# Altium footprint library BARKO_PCBLIB.PcbLib: 531 footprints (part 6 of 34)
Each footprint in its own frame and in the unit in brackets; x right, y up, seen from the top. Pads: shape width x height; smd on the part's side, far side on the other; paste and mask are expansions set on the pad; w line width, h text height; cw(c..) or ccw(c..) is an arc to the next point about the centre after c.
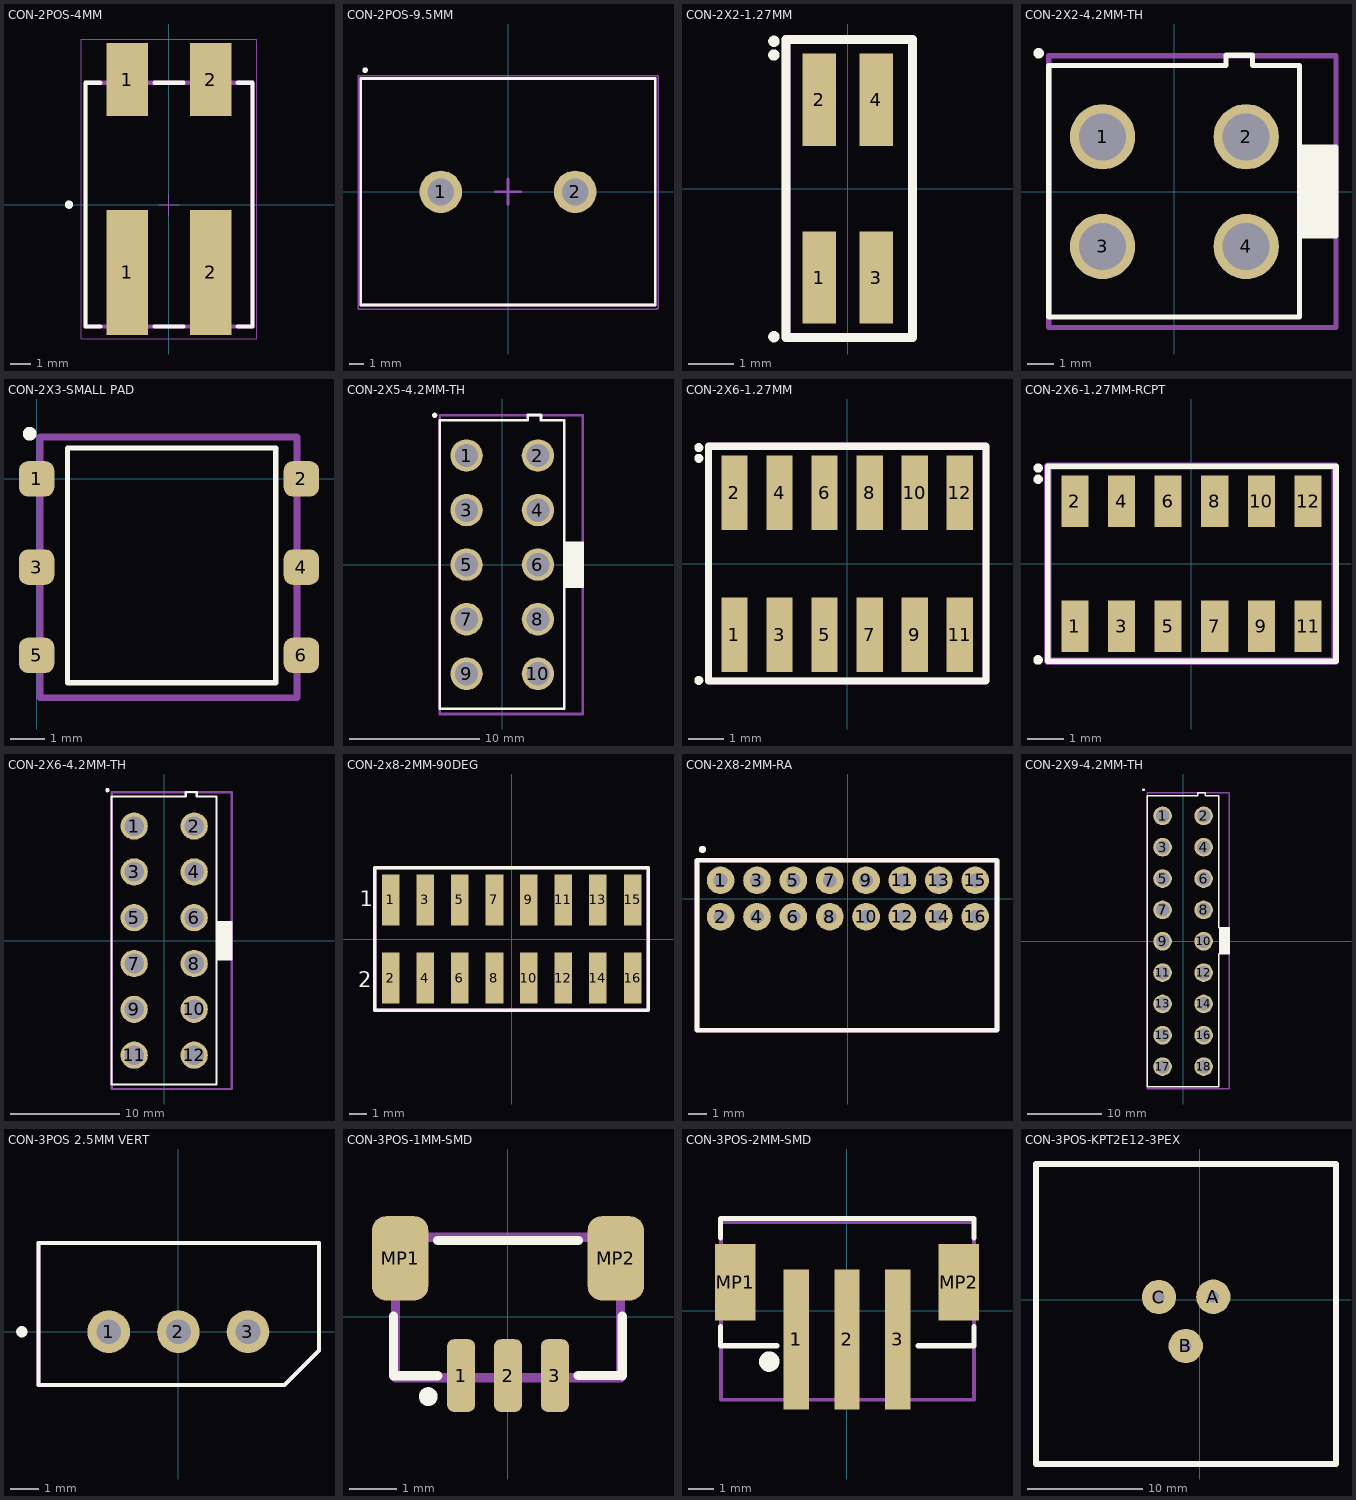
[diagram p5: the footprints below, top view; thin cyan lines are the x and y axes]

## CON-2POS-4MM [mm] "SMT Horizontal Entry Connector, 2p"
height 2.3
pads (4):
  rect 2x6 smd: 1(-2,-3.25) 2(2,-3.25)
  rect 2x3.5 smd: 1(-2,6) 2(2,6)
Top Overlay:
  circle w0.2: c-4.8,0 r0.1
  lines w0.2: -3.3,-5.85 -4,-5.85 -4,5.85 -3.3,5.85 ; -0.7,-5.85 0.7,-5.85 ; -0.7,5.85 0.7,5.85 ; 3.3,-5.85 4,-5.85 4,5.85 3.3,5.85
Mechanical 15:
  lines w0.05: -0.5,0 0.5,0 ; 0,-0.5 0,0.5 ; -4.2,-6.45 4.2,-6.45 4.2,7.95 -4.2,7.95 -4.2,-6.45
ASM Top:
  lines w0.2: -4,-5.85 4,-5.85 4,5.85 -4,5.85 -4,-5.85
  text ".designator" at -0.5,0 h0.8
3D body "695402400222.stp": height 4.57, standoff -0.03, extent -4,-5.85 4,7.25

## CON-2POS-9.5MM [mm]
pads (2):
  round 3 hole 1.9 unplated: 1(-4.75,0) 2(4.75,0)
Top Overlay:
  circle w0.2: c-10.1,8.6 r0.1
  lines w0.2: -10.4,-8 10.4,-8 10.4,8 -10.4,8 -10.4,-8
Mechanical 15:
  lines w0.1: -10.6,-8.3 -10.6,8.2 10.6,8.2 10.6,-8.2 10.5,-8.3 -10.6,-8.3
  lines w0.2: -0.9,0 0,0 ; 0,-0.9 0,0 ; 0,0.9 0,0 ; 0.9,0 0,0
ASM Top:
  lines w0.2: -10.4,-8 -10.4,8 10.4,8 10.4,-8 -10.4,-8
  text ".designator" at -0.6,-0.2 h1.5
3D body "c-3-1437664-0-m-3d.stp": height 16.4, standoff -4.56, extent -10.3,-7.938 10.3,7.937

## CON-2X2-1.27MM [mm]
pads (4):
  rect 0.74x2.05 smd mask+0.05: 1(-0.635,-1.975) 2(-0.635,1.975) 3(0.635,-1.975) 4(0.635,1.975)
Top Overlay:
  circle w0.15: c-1.64,3.275 r0.051
  circle w0.15: c-1.64,2.97 r0.051
  circle w0.15: c-1.64,-3.29 r0.051
  lines w0.15: -1.372,2.845 -1.372,3.31
  lines w0.2: -1.372,-3.31 1.445,-3.31 1.445,3.31 -1.372,3.31 -1.372,-3.31
ASM Top:
  lines w0.2: -1.372,-3.31 1.445,-3.31 1.445,3.31 -1.372,3.31 -1.372,-3.31
  text ".designator" at 0.11,-0.25 h0.8
3D body "FLE-102-01-G-DV.stp": height 4.56, standoff 0.01, extent -1.327,-2.297 1.327,2.297

## CON-2X2-4.2MM-TH [mm]
pads (4):
  round 2.5 hole 1.8: 1(-2.75,2.1) 2(2.75,2.1) 3(-2.75,-2.1) 4(2.75,-2.1)
Top Overlay:
  circle w0.2: c-5.2,5.3 r0.1
  rectangle: 4.787,-1.7 6.187,1.7
  lines w0.2: 4.787,3.825 4.787,-4.8 ; 4.787,-4.8 -4.813,-4.8 -4.813,4.824 1.977,4.825 1.977,5.224 2.988,5.224 2.988,4.825 4.787,4.825 4.787,1.7 6.187,1.7 6.187,-1.7 4.787,-1.7 4.787,-4.8
ASM Top:
  lines w0.2: -4.812,-5.2 -4.812,5.2 6.188,5.2 6.188,-5.2 -4.812,-5.2
  text ".designator" at -1.5,0 h0.8
3D body "039288040.stp": height 12.81, standoff -3.49, extent -4.8,-5.2 6.2,5.2

## CON-2X3-SMALL PAD [mil]
pads (6):
  rrect50% 40x40 smd mask+2: 1(0,0) 2(300,0) 3(0,-100) 4(300,-100) 5(0,-200) 6(300,-200)
Top Overlay:
  circle w7.87: c-7.87,51.18 r3.94
  lines w6: 35,-231 271,-231 271,35 35,35 35,-231
ASM Top:
  lines w7.87: 3.94,-248.03 3.94,47.24 295.28,47.24 295.28,-248.03 3.94,-248.03
  text ".designator" at 118.11,-82.68 h31.5
3D body "HN2X3 SMD.STEP": height 493.41, standoff 0.5, extent 3.66,-248 295,49.34

## CON-2X5-4.2MM-TH [mm]
pads (10):
  round 2.5 hole 1.8: 1(-2.75,8.4) 2(2.75,8.4) 3(-2.75,4.2) 4(2.75,4.2) 5(-2.75,0) 6(2.75,0) 7(-2.75,-4.2) 8(2.75,-4.2) 9(-2.75,-8.4) 10(2.75,-8.4)
Top Overlay:
  circle w0.2: c-5.2,11.5 r0.1
  rectangle: 4.787,-1.7 6.187,1.7
  lines w0.2: 4.787,10.124 4.787,-1.7 ; 4.787,-1.7 4.787,-11.1 -4.813,-11.1 -4.813,11.124 1.977,11.124 1.977,11.524 2.988,11.524 2.988,11.124 4.787,11.124 4.787,1.7 6.187,1.7 6.187,-1.7 4.787,-1.7
ASM Top:
  lines w0.2: -4.812,-11.5 -4.812,11.5 6.188,11.5 6.188,-11.5 -4.812,-11.5
  text ".designator" at -1.524,-0.243 h0.8
3D body "039293106.stp": height 12.81, standoff -3.49, extent -4.8,-11.5 6.2,11.5

## CON-2X6-1.27MM [mm] "CONN HEADER SMD 12POS 1.27MM"
pads (12):
  rect 0.74x2.1 smd mask+0.05: 1(-3.175,-2) 2(-3.175,2) 3(-1.905,-2) 4(-1.905,2) 5(-0.635,-2) 6(-0.635,2) 7(0.635,-2) 8(0.635,2) 9(1.905,-2) 10(1.905,2) 11(3.175,-2) 12(3.175,2)
Top Overlay:
  circle w0.15: c-4.18,-3.29 r0.051
  circle w0.15: c-4.18,2.97 r0.051
  circle w0.15: c-4.18,3.275 r0.051
  lines w0.15: -3.912,2.845 -3.912,3.31
  lines w0.2: -3.912,-3.31 -3.912,3.31 3.912,3.31 3.912,-3.31 -3.912,-3.31
ASM Top:
  lines w0.2: -3.912,-3.31 -3.912,3.31 3.912,3.31 3.912,-3.31 -3.912,-3.31
  text ".designator" at -2.43,-0.25 h0.8
3D body "FTSH-106-01-F-DV-P-TR.stp": height 7, standoff 0.01, extent -3.81,-2.921 3.81,2.921

## CON-2X6-1.27MM-RCPT [mm] "CONN RCPT 12POS 0.05 GOLD SMD"
pads (12):
  rect 0.74x1.4 smd mask+0.05: 1(-3.175,-1.7) 2(-3.175,1.7) 3(-1.905,-1.7) 4(-1.905,1.7) 5(-0.635,-1.7) 6(-0.635,1.7) 7(0.635,-1.7) 8(0.635,1.7) 9(1.905,-1.7) 10(1.905,1.7) 11(3.175,-1.7) 12(3.175,1.7)
Top Overlay:
  circle w0.15: c-4.18,-2.62 r0.055
  circle w0.15: c-4.176,2.3 r0.051
  circle w0.15: c-4.176,2.605 r0.051
  lines w0.15: -3.912,-2.66 -3.912,2.66 1.79,2.66 3.937,2.66 3.937,-2.66 -3.912,-2.66
ASM Top:
  lines w0.2: -3.912,-2.66 3.912,-2.66 3.912,2.66 -3.912,2.66 -3.912,-2.66
  text ".designator" at -2.85,-0.24 h0.8
3D body "FLE-106-01-G-DV-K-TR.stp": height 4.69, standoff 0.01, extent -3.867,-2.297 3.867,2.297

## CON-2X6-4.2MM-TH [mm]
pads (12):
  round 2.5 hole 1.8: 1(-2.75,10.5) 2(2.75,10.5) 3(-2.75,6.3) 4(2.75,6.3) 5(-2.75,2.1) 6(2.75,2.1) 7(-2.75,-2.1) 8(2.75,-2.1) 9(-2.75,-6.3) 10(2.75,-6.3) 11(-2.75,-10.5) 12(2.75,-10.5)
Top Overlay:
  circle w0.2: c-5.2,13.8 r0.1
  rectangle: 4.787,-1.7 6.187,1.7
  lines w0.2: 4.787,12.224 4.787,-1.7 ; 4.787,-1.7 4.787,-13.2 -4.813,-13.2 -4.813,13.224 1.977,13.224 1.977,13.624 2.988,13.624 2.988,13.224 4.787,13.224 4.787,1.7 6.187,1.7 6.187,-1.7 4.787,-1.7
ASM Top:
  lines w0.2: -4.812,-13.6 -4.812,13.6 6.188,13.6 6.188,-13.6 -4.812,-13.6
  text ".designator" at -2.1,0 h0.8
3D body "039293126.stp": height 12.81, standoff -3.49, extent -4.8,-13.6 6.2,13.6

## CON-2x8-2MM-90DEG [mil]
pads (16):
  rect 40x116 smd: 1(-276,89) 2(-276,-89) 3(-197,89) 4(-197,-89) 5(-118,89) 6(-118,-89) 7(-39,89) 8(-39,-89) 9(39,89) 10(39,-89) 11(118,89) 12(118,-89) 13(197,89) 14(197,-89) 15(276,89) 16(276,-89)
Top Overlay:
  lines w8: -312,-163 -312,163 312,163 312,-163 -312,-163
  text "1" at -346.46,62.99 h60
  text "2" at -350.39,-122.05 h60
ASM Top:
  lines w8: -312,-163 -312,163 312,163 312,-163 -312,-163
  text ".designator" at -299,-13 h31.5
3D body "2x8 2mm 90.stp": height 235.5, standoff 0.5, extent -313.95,-139.99 315.97,138.01

## CON-2X8-2MM-RA [mil]
pads (16):
  round 60 hole 30: 1(-275.59,39.37) 2(-275.59,-39.37) 3(-196.85,39.37) 4(-196.85,-39.37) 5(-118.11,39.37) 6(-118.11,-39.37) 7(-39.37,39.37) 8(-39.37,-39.37) 9(39.37,39.37) 10(39.37,-39.37) 11(118.11,39.37) 12(118.11,-39.37) 13(196.85,39.37) 14(196.85,-39.37) 15(275.59,39.37) 16(275.59,-39.37)
Top Overlay:
  circle w7.87: c-314.96,106.3 r3.94
  lines w10: -326.77,-285.52 -326.77,82.68 322.83,82.68 322.83,-285.52 -326.77,-285.52
ASM Top:
  lines w10: -326.77,-285.52 322.83,-285.52 322.83,82.68 -326.77,82.68 -326.77,-285.52
  text ".designator" at -303.15,-122.05 h31.5
3D body "2x8-2MM-RA-HEADER.stp": height 159.3, standoff -116.61, extent -314.96,-285.52 314.96,49.3

## CON-2X9-4.2MM-TH [mm]
pads (18):
  round 2.5 hole 1.8: 1(-2.75,16.8) 2(2.75,16.8) 3(-2.75,12.6) 4(2.75,12.6) 5(-2.75,8.4) 6(2.75,8.4) 7(-2.75,4.2) 8(2.75,4.2) 9(-2.75,0) 10(2.75,0) 11(-2.75,-4.2) 12(2.75,-4.2) 13(-2.75,-8.4) 14(2.75,-8.4) 15(-2.75,-12.6) 16(2.75,-12.6) 17(-2.75,-16.8) 18(2.75,-16.8)
Top Overlay:
  circle w0.2: c-5.3,20.3 r0.1
  rectangle: 4.787,-1.7 6.187,1.7
  lines w0.2: 4.787,4.6 4.787,18.524 ; -4.813,-19.5 4.787,-19.5 4.787,-1.7 6.187,-1.7 6.187,1.8 4.787,1.8 4.787,19.524 2.988,19.524 2.988,19.924 1.977,19.924 1.977,19.524 -4.813,19.524 -4.813,-19.5
ASM Top:
  lines w0.2: -4.812,-19.8 6.188,-19.8 6.188,19.9 -4.812,19.9 -4.812,-19.8
  text ".designator" at -2.75,0 h0.8
3D body "039281183.stp": height 12.81, standoff -3.49, extent -4.8,-19.9 6.2,19.9

## CON-3POS 2.5MM VERT [mil]
pads (3):
  round 60 hole 35: 1(-98,0) 2(0,0) 3(98,0)
Top Overlay:
  circle w7.87: c-220.47,0 r3.94
  lines w6: -197,-75 149.41,-75 198,-26.41 198,125 -197,125 -197,-75
ASM Top:
  lines w6: -197,-75 149.41,-75 198,-26.41 198,125 -197,125 -197,-75
  text ".designator" at -47.24,47.24 h31.5
3D body "022035035.stp": height 231.14, standoff -138.94, extent -194.88,-72.05 194.88,120.87

## CON-3POS-1MM-SMD [mm]
pads (5):
  rrect50% 0.6x1.55 smd mask+0.05: 1(-1,-1.25) 2(0,-1.25) 3(1,-1.25)
  rrect50% 1.2x1.8 smd mask+0.05: MP1(-2.3,1.25) MP2(2.3,1.25)
Top Overlay:
  circle w0.2: c-1.7,-1.7 r0.1
  lines w0.2: -2.442,0.015 -2.442,-1.251 -1.5,-1.251 ; -1.5,1.631 1.5,1.631 ; 1.5,-1.25 2.44,-1.25 ; 2.441,-1.251 2.441,0.015
ASM Top:
  lines w0.2: -2.4,1.7 -2.4,-1.3 2.4,-1.3 2.4,1.7 -2.35,1.7
  text ".designator" at -0.4,-0.2 h0.8
3D body "5013310307.stp": height 5.5, standoff -0.04, extent -2.62,-1.91 2.62,1.94

## CON-3POS-2MM-SMD [mm]
pads (6):
  rect 1x5.5 smd: 1(-2,-1.125) 1(-2,-1.125) 2(0,-1.125) 3(2,-1.125)
  rect 1.6x3 smd: MP1(-4.4,1.125) MP2(4.4,1.125)
Top Overlay:
  circle w0.4: c-3.058,-1.999 r0.2
  lines w0.2: -4.975,-0.625 -4.975,-1.375 -2.75,-1.375 ; -4.975,2.875 -4.975,3.625 5,3.625 5,2.875 ; 2.8,-1.375 5,-1.375 5,-0.625
ASM Top:
  lines w0.152: -4.95,3.5 5,3.5 5,1.5 5,-3.5 -4.95,-3.5 -4.95,3.5 ; -4.95,3.5 -4.95,3.5
  text ".designator" at -1.4,-0.4 h0.8
3D body "B3B-PH-SM4-TB.STEP": height 6.61, standoff 0.01, extent -4.975,-3.5 4.975,3.5

## CON-3POS-KPT2E12-3PEX [mm]
pads (3):
  round 3 hole 1: A(1.18,0.25) B(-1.22,-4.04) C(-3.56,0.23)
Top Overlay:
  lines w0.5: -14.282,-14.325 -14.282,11.825 11.878,11.825 11.878,-14.325 -14.282,-14.325
3D body "KPT2E123PEX.stp": height 20.39, standoff -9.37, extent -14.282,-14.325 11.878,11.825